# Altium footprint library 智能锁实践教学平台.PcbLib: 58 footprints (part 3 of 4)
Each footprint in its own frame and in the unit in brackets; x right, y up, seen from the top. Pads: shape width x height; smd on the part's side, far side on the other; paste and mask are expansions set on the pad; w line width, h text height; cw(c..) or ccw(c..) is an arc to the next point about the centre after c.
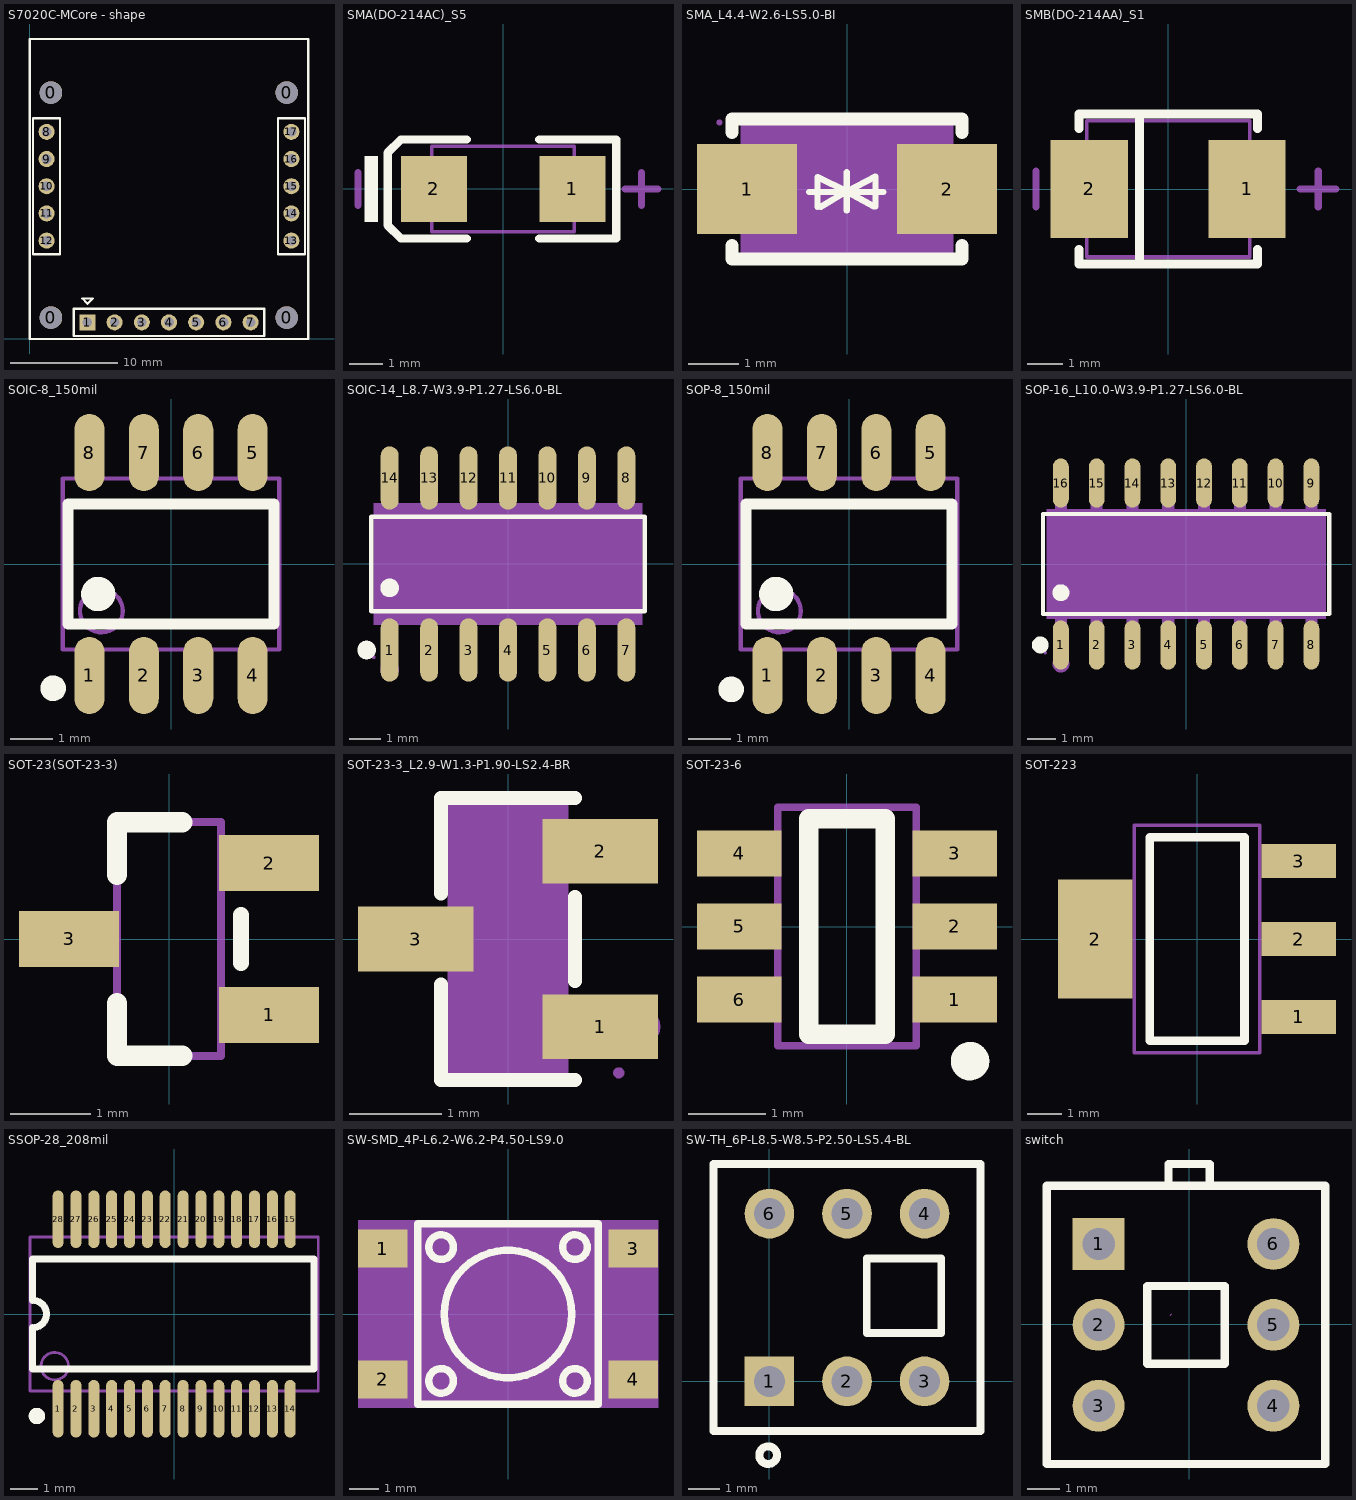
[diagram p2: the footprints below, top view; thin cyan lines are the x and y axes]

## S7020C-MCore - shape [mm]
pads (21):
  round 2.1 hole 2.1 unplated: 0(1.975,1.995) 0(1.975,22.995) 0(23.975,1.995) 0(23.975,22.995)
  rect 1.5x1.5 hole 0.9: 1(5.369,1.549)
  round 1.5 hole 0.9: 2(7.909,1.549) 3(10.449,1.549) 4(12.989,1.549) 5(15.529,1.549) 6(18.069,1.549) 7(20.609,1.549) 8(1.56,19.329) 9(1.56,16.789) 10(1.56,14.249) 11(1.56,11.709) 12(1.56,9.169) 13(24.42,9.169) 14(24.42,11.709) 15(24.42,14.249) 16(24.42,16.789) 17(24.42,19.329)
Top Overlay:
  lines w0.2: -0.01,-0.009 -0.01,27.991 ; 0,-0.009 25.975,-0.009 ; 0,27.991 25.978,27.991 ; 25.988,-0.006 25.988,27.991 ; 0.29,7.899 0.29,20.599 2.83,20.599 2.83,7.899 0.29,7.899 ; 4.099,0.279 4.099,2.819 21.879,2.819 21.879,0.279 4.099,0.279 ; 4.877,3.785 5.893,3.785 5.385,3.277 4.877,3.785 ; 23.15,7.899 23.15,20.599 25.69,20.599 25.69,7.899 23.15,7.899
Keep-Out Layer:
  lines w0.127: 25.975,0.011 25.978,0.014

## SMA(DO-214AC)_S5 [mm]
height 12
pads (2):
  rect 2x2 smd: 1(2.1,0) 2(-2.1,0)
Top Overlay:
  rectangle: -4.201,-1.002 -3.801,0.998
  lines w0.254: -1.1,-1.5 -3.1,-1.5 -3.5,-1.1 -3.5,1.1 -3.1,1.5 -1.1,1.5 ; 1.1,-1.5 3.431,-1.5 3.431,1.5 1.1,1.5
Mechanical 13:
  lines w0.1: -2.16,-1.3 -2.16,1.3 2.16,1.3 2.16,-1.3 -2.16,-1.3
Mechanical 15:
  lines w0.203: -4.4,-0.5 -4.4,0.5 ; 3.7,0 4.7,0 ; 4.2,-0.5 4.2,0.5

## SMA_L4.4-W2.6-LS5.0-BI [mm]
pads (2):
  rect 2x1.8 smd: 1(-2,0) 2(2,0)
Top Overlay:
  lines w0.127: -0.76,-0.06 0.73,-0.06 ; -0.59,-0.36 -0.59,0.24 -0.002,-0.049 ; -0.53,-0.36 -0.002,-0.049 ; -0.002,-0.43 -0.002,-0.049 ; -0.002,0.332 -0.002,-0.049 ; 0.54,-0.35 -0.002,-0.049 ; 0.57,-0.35 0.57,0.25 -0.002,-0.049
  lines w0.254: -2.3,-1.131 -2.3,-1.4 2.3,-1.4 2.3,-1.131 ; -2.3,1.131 -2.3,1.4 2.3,1.4 2.3,1.131
Mechanical 4:
  region: -2.123,1.333 2.123,1.333 2.123,-1.333 -2.123,-1.333
Mechanical 5:
  region: -1.412,0.725 -1.412,-0.725 -2.552,-0.725 -2.552,0.725
  region: 1.412,-0.725 1.412,0.725 2.552,0.725 2.552,-0.725
Mechanical 6:
  circle w0.06: c-2.552,1.332 r0.03

## SMB(DO-214AA)_S1 [mm]
height 12
pads (2):
  rect 2.159x2.743 smd: 1(2.21,0) 2(-2.21,0)
Top Overlay:
  lines w0.254: -2.5,-1.7 -2.5,-2.1 2.5,-2.1 2.5,-1.7 ; -2.5,1.7 -2.5,2.1 2.5,2.1 2.5,1.7 ; -0.8,-2.1 -0.8,2.1
Mechanical 13:
  lines w0.1: -2.285,-1.905 -2.285,1.905 2.285,1.905 2.285,-1.905 -2.285,-1.905
Mechanical 15:
  lines w0.203: -3.7,-0.5 -3.7,0.5 ; 3.7,0 4.7,0 ; 4.2,-0.5 4.2,0.5

## SOIC-8_150mil [mm]
height 12
pads (8):
  oval 0.7x1.8 smd: 1(-1.905,-2.6) 2(-0.635,-2.6) 3(0.635,-2.6) 4(1.905,-2.6) 5(1.905,2.6) 6(0.635,2.6) 7(-0.635,2.6) 8(-1.905,2.6)
Top Overlay:
  circle w0.4: c-1.7,-0.7 r0.2
  circle w0.3: c-2.75,-2.9 r0.15
  lines w0.254: -2.4,-1.4 -2.4,1.4 2.4,1.4 2.4,-1.4 -2.4,-1.4
Mechanical 13:
  circle w0.1: c-1.625,-1.095 r0.5
  lines w0.1: -2.525,-1.995 -2.525,1.995 2.525,1.995 2.525,-1.995 -2.525,-1.995

## SOIC-14_L8.7-W3.9-P1.27-LS6.0-BL [mm]
pads (14):
  oval 0.574x2.038 smd: 1(-3.81,-2.769) 2(-2.54,-2.769) 3(-1.27,-2.769) 4(0,-2.769) 5(1.27,-2.769) 6(2.54,-2.769) 7(3.81,-2.769) 8(3.81,2.769) 9(2.54,2.769) 10(1.27,2.769) 11(0,2.769) 12(-1.27,2.769) 13(-2.54,2.769) 14(-3.81,2.769)
Top Overlay:
  circle w0.3: c-4.549,-2.769 r0.15
  circle w0.3: c-3.81,-0.769 r0.15
  lines w0.152: -4.401,-1.521 4.401,-1.521 4.401,1.521 -4.401,1.521 -4.401,-1.521
Mechanical 4:
  region: -4.325,-1.95 -4.325,1.95 4.325,1.95 4.325,-1.95
Mechanical 5:
  pour cut-out: 3.605,2.175 3.605,1.94 4.015,1.94 4.015,2.175
  region: 3.605,3 3.605,2.165 4.015,2.165 4.015,3
  pour cut-out: 2.335,2.175 2.335,1.94 2.745,1.94 2.745,2.175
  region: 2.335,3 2.335,2.165 2.745,2.165 2.745,3
  pour cut-out: 1.065,2.175 1.065,1.94 1.475,1.94 1.475,2.175
  region: 1.065,3 1.065,2.165 1.475,2.165 1.475,3
  pour cut-out: -0.205,2.175 -0.205,1.94 0.205,1.94 0.205,2.175
  region: -0.205,3 -0.205,2.165 0.205,2.165 0.205,3
  pour cut-out: -1.475,2.175 -1.475,1.94 -1.065,1.94 -1.065,2.175
  region: -1.475,3 -1.475,2.165 -1.065,2.165 -1.065,3
  pour cut-out: -2.745,2.175 -2.745,1.94 -2.335,1.94 -2.335,2.175
  region: -2.745,3 -2.745,2.165 -2.335,2.165 -2.335,3
  pour cut-out: -4.015,2.175 -4.015,1.94 -3.605,1.94 -3.605,2.175
  region: -4.015,3 -4.015,2.165 -3.605,2.165 -3.605,3
  pour cut-out: 3.605,-2.175 3.605,-1.94 4.015,-1.94 4.015,-2.175
  region: 3.605,-3 3.605,-2.165 4.015,-2.165 4.015,-3
  pour cut-out: 2.335,-2.175 2.335,-1.94 2.745,-1.94 2.745,-2.175
  region: 2.335,-3 2.335,-2.165 2.745,-2.165 2.745,-3
  pour cut-out: 1.065,-2.175 1.065,-1.94 1.475,-1.94 1.475,-2.175
  region: 1.065,-3 1.065,-2.165 1.475,-2.165 1.475,-3
  pour cut-out: -0.205,-2.175 -0.205,-1.94 0.205,-1.94 0.205,-2.175
  region: -0.205,-3 -0.205,-2.165 0.205,-2.165 0.205,-3
  pour cut-out: -1.475,-2.175 -1.475,-1.94 -1.065,-1.94 -1.065,-2.175
  region: -1.475,-3 -1.475,-2.165 -1.065,-2.165 -1.065,-3
  pour cut-out: -2.745,-2.175 -2.745,-1.94 -2.335,-1.94 -2.335,-2.175
  region: -2.745,-3 -2.745,-2.165 -2.335,-2.165 -2.335,-3
  pour cut-out: -4.015,-2.175 -4.015,-1.94 -3.605,-1.94 -3.605,-2.175
  region: -4.015,-3 -4.015,-2.165 -3.605,-2.165 -3.605,-3
Mechanical 6:
  circle w0.06: c-4.325,-3 r0.03
Mechanical 15:
  circle w0.3: c-3.81,-3.4 r0.15

## SOP-8_150mil [mm]
pads (8):
  oval 0.7x1.8 smd: 1(-1.905,-2.6) 2(-0.635,-2.6) 3(0.635,-2.6) 4(1.905,-2.6) 5(1.905,2.6) 6(0.635,2.6) 7(-0.635,2.6) 8(-1.905,2.6)
Top Overlay:
  circle w0.4: c-1.7,-0.7 r0.2
  circle w0.3: c-2.75,-2.925 r0.15
  lines w0.254: -2.4,-1.4 -2.4,1.4 2.4,1.4 2.4,-1.4 -2.4,-1.4
Mechanical 13:
  circle w0.1: c-1.625,-1.095 r0.5
  lines w0.1: -2.525,-1.995 -2.525,1.995 2.525,1.995 2.525,-1.995 -2.525,-1.995
3D body: height 1.75, standoff 0, extent -2.5,-3.1 2.5,3.1

## SOP-16_L10.0-W3.9-P1.27-LS6.0-BL [mm]
pads (16):
  oval 0.56x1.745 smd: 1(-4.445,-2.873) 2(-3.175,-2.873) 3(-1.905,-2.873) 4(-0.635,-2.873) 5(0.635,-2.873) 6(1.905,-2.873) 7(3.175,-2.873) 8(4.445,-2.873) 9(4.445,2.873) 10(3.175,2.873) 11(1.905,2.873) 12(0.635,2.873) 13(-0.635,2.873) 14(-1.905,2.873) 15(-3.175,2.873) 16(-4.445,2.873)
Top Overlay:
  circle w0.3: c-4.445,-1.019 r0.15
  circle w0.3: c-5.177,-2.872 r0.15
  lines w0.152: -5.076,-1.771 -5.076,1.771 5.076,1.771 5.076,-1.771 -5.076,-1.771
Mechanical 4:
  region: -4.95,-1.95 -4.95,1.95 4.95,1.95 4.95,-1.95
Mechanical 5:
  pour cut-out: 4.24,1.94 4.24,2.175 4.65,2.175 4.65,1.94
  region: 4.24,2.165 4.24,3 4.65,3 4.65,2.165
  pour cut-out: 2.97,1.94 2.97,2.175 3.38,2.175 3.38,1.94
  region: 2.97,2.165 2.97,3 3.38,3 3.38,2.165
  pour cut-out: 1.7,1.94 1.7,2.175 2.11,2.175 2.11,1.94
  region: 1.7,2.165 1.7,3 2.11,3 2.11,2.165
  pour cut-out: 0.43,1.94 0.43,2.175 0.84,2.175 0.84,1.94
  region: 0.43,2.165 0.43,3 0.84,3 0.84,2.165
  pour cut-out: -0.84,1.94 -0.84,2.175 -0.43,2.175 -0.43,1.94
  region: -0.84,2.165 -0.84,3 -0.43,3 -0.43,2.165
  pour cut-out: -2.11,1.94 -2.11,2.175 -1.7,2.175 -1.7,1.94
  region: -2.11,2.165 -2.11,3 -1.7,3 -1.7,2.165
  pour cut-out: -3.38,1.94 -3.38,2.175 -2.97,2.175 -2.97,1.94
  region: -3.38,2.165 -3.38,3 -2.97,3 -2.97,2.165
  pour cut-out: -4.65,1.94 -4.65,2.175 -4.24,2.175 -4.24,1.94
  region: -4.65,2.165 -4.65,3 -4.24,3 -4.24,2.165
  pour cut-out: 4.24,-2.175 4.24,-1.94 4.65,-1.94 4.65,-2.175
  region: 4.24,-3 4.24,-2.165 4.65,-2.165 4.65,-3
  pour cut-out: 2.97,-2.175 2.97,-1.94 3.38,-1.94 3.38,-2.175
  region: 2.97,-3 2.97,-2.165 3.38,-2.165 3.38,-3
  pour cut-out: 1.7,-2.175 1.7,-1.94 2.11,-1.94 2.11,-2.175
  region: 1.7,-3 1.7,-2.165 2.11,-2.165 2.11,-3
  pour cut-out: 0.43,-2.175 0.43,-1.94 0.84,-1.94 0.84,-2.175
  region: 0.43,-3 0.43,-2.165 0.84,-2.165 0.84,-3
  pour cut-out: -0.84,-2.175 -0.84,-1.94 -0.43,-1.94 -0.43,-2.175
  region: -0.84,-3 -0.84,-2.165 -0.43,-2.165 -0.43,-3
  pour cut-out: -2.11,-2.175 -2.11,-1.94 -1.7,-1.94 -1.7,-2.175
  region: -2.11,-3 -2.11,-2.165 -1.7,-2.165 -1.7,-3
  pour cut-out: -3.38,-2.175 -3.38,-1.94 -2.97,-1.94 -2.97,-2.175
  region: -3.38,-3 -3.38,-2.165 -2.97,-2.165 -2.97,-3
  pour cut-out: -4.65,-2.175 -4.65,-1.94 -4.24,-1.94 -4.24,-2.175
  region: -4.65,-3 -4.65,-2.165 -4.24,-2.165 -4.24,-3
Mechanical 6:
  circle w0.06: c-5,-3.15 r0.03
Mechanical 15:
  circle w0.3: c-4.445,-3.55 r0.15

## SOT-23(SOT-23-3) [mm]
height 12
pads (3):
  rect 1.25x0.7 smd: 1(1.25,-0.95) 2(1.25,0.95) 3(-1.25,0)
Top Overlay:
  lines w0.2: 0.9,-0.3 0.9,0.3
  lines w0.254: -0.65,-0.8 -0.65,-1.46 0.165,-1.46 ; 0.165,1.46 -0.65,1.46 ; -0.65,0.8 -0.65,1.46 ; -0.65,0.8 -0.65,1.46 ; -0.65,0.8 -0.65,1.46
Mechanical 13:
  lines w0.1: -0.65,-1.46 -0.65,1.46 ; -0.65,-1.46 0.65,-1.46 ; -0.65,-1.46 0.65,-1.46 ; -0.65,-1.46 -0.65,1.46 ; -0.65,-1.46 0.65,-1.46 ; -0.65,-1.46 -0.65,1.46 ; -0.65,1.46 0.65,1.46 ; -0.65,1.46 0.65,1.46 ; -0.65,1.46 0.65,1.46 ; 0.65,-1.46 0.65,1.46 ; 0.65,-1.46 0.65,1.46 ; 0.65,-1.46 0.65,1.46
3D body: height 1.3, standoff 0, extent -1.5,-1.5 1.5,1.5

## SOT-23-3_L2.9-W1.3-P1.90-LS2.4-BR [mm]
pads (3):
  rect 1.25x0.7 smd: 1(1,-0.95) 2(1,0.95) 3(-1,0)
Top Overlay:
  lines w0.152: -0.726,-0.495 -0.726,-1.526 0.726,-1.526 ; -0.726,0.495 -0.726,1.526 0.726,1.526 ; 0.726,-0.455 0.726,0.455
Mechanical 4:
  region: -0.65,-1.45 -0.65,1.45 0.65,1.45 0.65,-1.45
Mechanical 5:
  region: -1.2,-0.215 -1.2,0.215 -0.9,0.215 -0.9,-0.215
  pour cut-out: -0.91,-0.215 -0.91,0.215 -0.64,0.215 -0.64,-0.215
  region: 0.9,-1.165 0.9,-0.735 1.2,-0.735 1.2,-1.165
  pour cut-out: 0.64,-1.165 0.64,-0.735 0.91,-0.735 0.91,-1.165
  region: 0.9,0.735 0.9,1.165 1.2,1.165 1.2,0.735
  pour cut-out: 0.64,0.735 0.64,1.165 0.91,1.165 0.91,0.735
Mechanical 6:
  circle w0.06: c1.2,-1.45 r0.03
Mechanical 15:
  circle w0.2: c1.45,-0.95 r0.1

## SOT-23-6 [mm]
pads (6):
  rect 1.1x0.6 smd: 1(1.4,-0.95) 2(1.4,0) 3(1.4,0.95) 4(-1.4,0.95) 5(-1.4,0) 6(-1.4,-0.95)
Top Overlay:
  circle w0.25: c1.6,-1.75 r0.125
  lines w0.254: -0.5,-1.4 -0.5,1.4 0.5,1.4 0.5,-1.4 -0.5,-1.4
Mechanical 13:
  lines w0.1: -0.9,-1.55 -0.9,1.55 0.9,1.55 0.9,-1.55 -0.9,-1.55

## SOT-223 [mm]
pads (4):
  rect 2.2x1 smd: 1(3,-2.3) 2(3,0) 3(3,2.3)
  rect 2.2x3.5 smd: 2(-3,0)
Top Overlay:
  lines w0.254: -1.4,-3 -1.4,3 1.4,3 1.4,-3 -1.4,-3
Mechanical 13:
  lines w0.1: -1.85,-3.35 1.85,-3.35 1.85,3.35 -1.85,3.35 -1.85,-3.35
3D body: height 1.64, standoff -0.04, extent -3.49,-3.242 3.49,3.243

## SSOP-28_208mil [mm]
pads (28):
  oval 0.4x2.1 smd mask+0.051: 1(-4.225,-3.45) 2(-3.575,-3.45) 3(-2.925,-3.45) 4(-2.275,-3.45) 5(-1.625,-3.45) 6(-0.975,-3.45) 7(-0.325,-3.45) 8(0.325,-3.45) 9(0.975,-3.45) 10(1.625,-3.45) 11(2.275,-3.45) 12(2.925,-3.45) 13(3.575,-3.45) 14(4.225,-3.45) 15(4.225,3.45) 16(3.575,3.45) 17(2.925,3.45) 18(2.275,3.45) 19(1.625,3.45) 20(0.975,3.45) 21(0.325,3.45) 22(-0.325,3.45) 23(-0.975,3.45) 24(-1.625,3.45) 25(-2.275,3.45) 26(-2.925,3.45) 27(-3.575,3.45) 28(-4.225,3.45)
Top Overlay:
  circle w0.3: c-4.998,-3.715 r0.15
  lines w0.254: -5.15,-2 -5.15,-0.5 ccw(c-5.15,0) -5.15,0.5 -5.15,2 5.1,2 5.1,-2 -5.15,-2
Mechanical 13:
  circle w0.1: c-4.35,-1.9 r0.5
  lines w0.1: -5.25,-2.8 -5.25,2.8 5.25,2.8 5.25,-2.8 -5.25,-2.8

## SW-SMD_4P-L6.2-W6.2-P4.50-LS9.0 [mm]
pads (4):
  rect 1.7x1.3 smd: 1(-4.3,2.25) 2(-4.3,-2.25) 3(4.3,2.25) 4(4.3,-2.25)
Top Overlay:
  circle w0.254: c0,0 r2.192
  circle w0.254: c-2.3,2.3 r0.424
  circle w0.254: c2.3,2.3 r0.424
  circle w0.254: c-2.3,-2.3 r0.424
  circle w0.254: c2.3,-2.3 r0.424
  lines w0.254: -3.1,-3.1 3.1,-3.1 3.1,3.1 -3.1,3.1 -3.1,-3.1
Mechanical 4:
  region: -5.156,3.227 5.156,3.227 5.156,-3.227 -5.156,-3.227
Mechanical 5:
  region: -5.15,2.9 -3.45,2.9 -3.45,1.6 -5.15,1.6
  region: 3.45,2.9 5.15,2.9 5.15,1.6 3.45,1.6
  region: -5.15,-1.6 -3.45,-1.6 -3.45,-2.9 -5.15,-2.9
  region: 3.45,-1.6 5.15,-1.6 5.15,-2.9 3.45,-2.9

## SW-TH_6P-L8.5-W8.5-P2.50-LS5.4-BL [mm]
pads (6):
  rect 1.6x1.6 hole 1: 1(0,0)
  round 1.6 hole 1: 2(2.5,0) 3(5,0) 4(5,5.4) 5(2.5,5.4) 6(0,5.4)
Top Overlay:
  circle w0.254: c-0.04,-2.38 r0.284
  lines w0.254: -1.8,-1.6 6.8,-1.6 6.8,7 -1.8,7 -1.8,-1.6 ; 3.135,1.557 5.535,1.557 5.535,3.957 3.135,3.957 3.135,1.557

## switch [mm]
pads (6):
  rect 1.6x1.6 hole 1: 1(-2.797,2.482)
  round 1.6 hole 1: 2(-2.797,-0.018) 3(-2.797,-2.518) 4(2.603,-2.518) 5(2.603,-0.018) 6(2.603,2.482)
Top Overlay:
  lines w0.254: -0.635,4.282 -0.635,4.953 0.635,4.953 0.635,4.282 ; -4.397,-4.318 4.203,-4.318 4.203,4.282 -4.397,4.282 -4.397,-4.318 ; -1.297,-1.218 1.103,-1.218 1.103,1.182 -1.297,1.182 -1.297,-1.218
Mechanical 15:
  lines w0.003: -0.591,0.271 -0.54,0.322